# Altium footprint library 20210518.PcbLib: 414 footprints (part 2 of 26)
Each footprint in its own frame and in the unit in brackets; x right, y up, seen from the top. Pads: shape width x height; smd on the part's side, far side on the other; paste and mask are expansions set on the pad; w line width, h text height; cw(c..) or ccw(c..) is an arc to the next point about the centre after c.
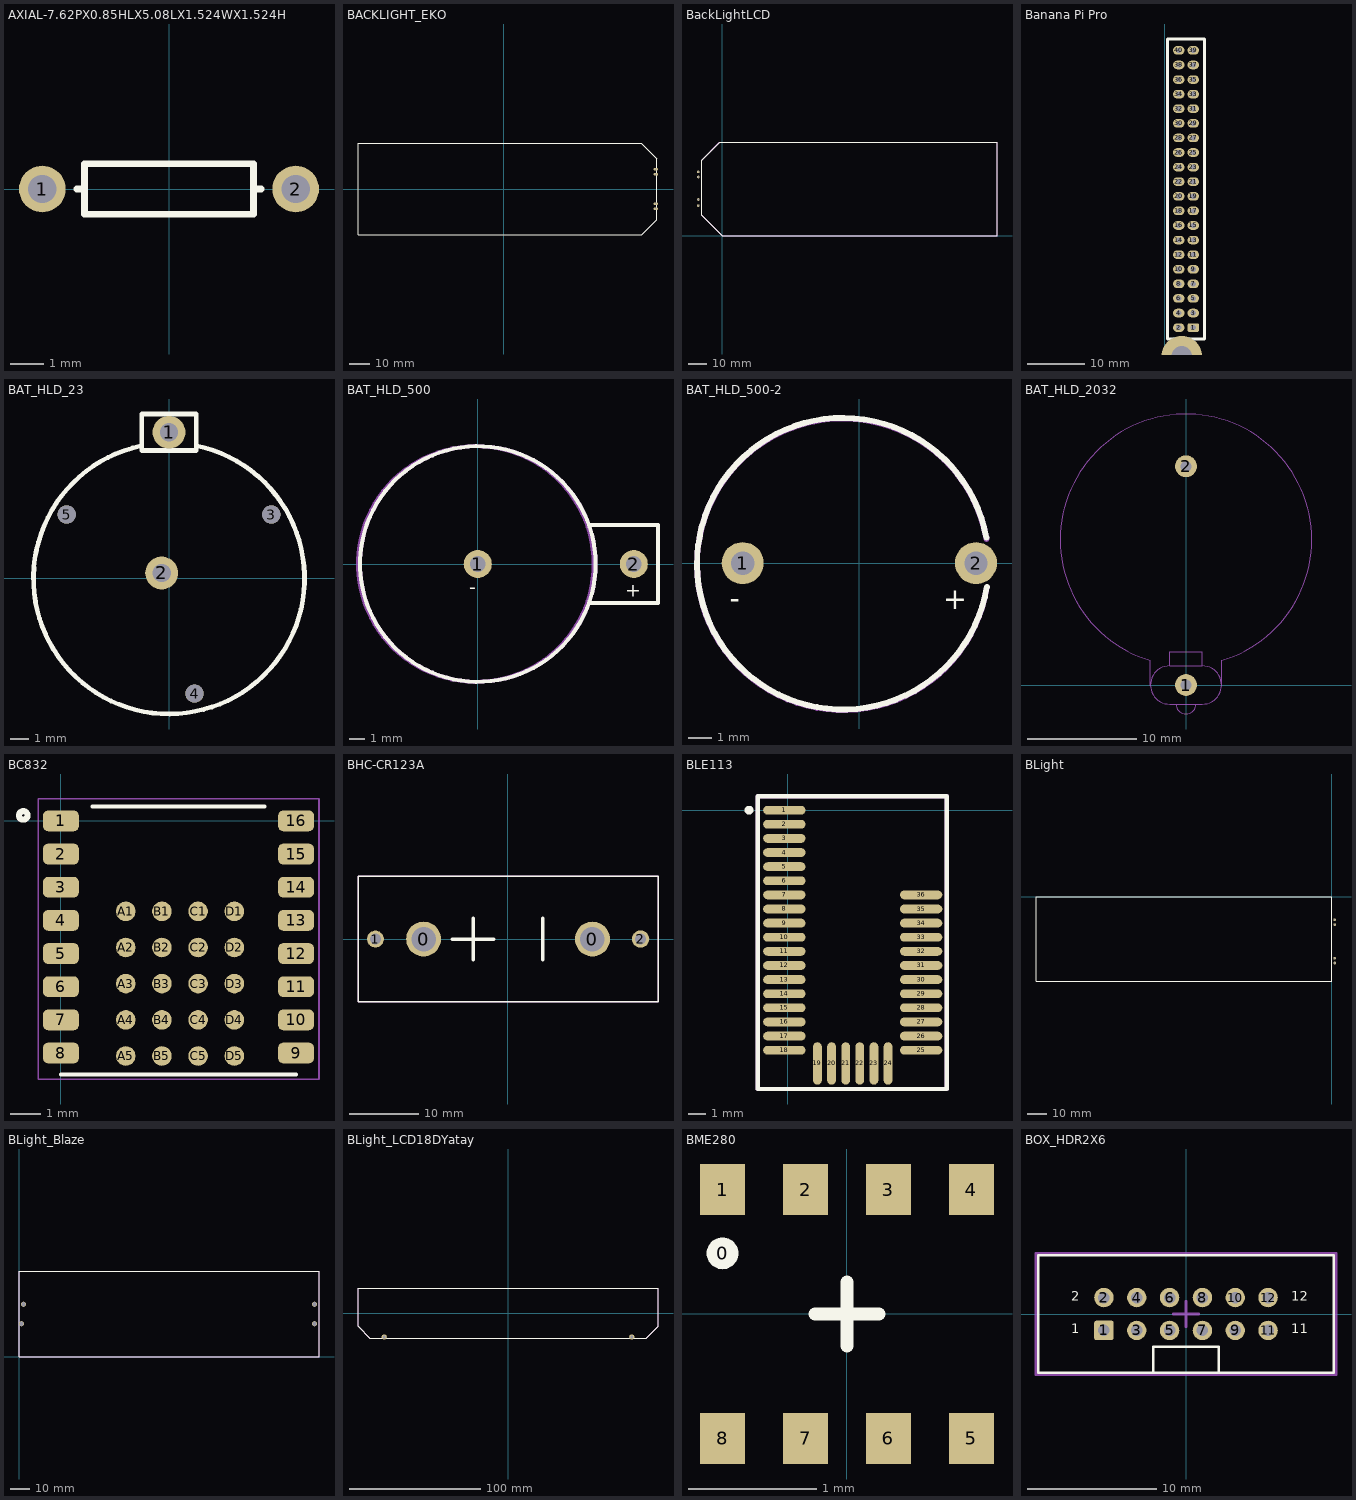
[diagram p1: the footprints below, top view; thin cyan lines are the x and y axes]

## AXIAL-7.62PX0.85HLX5.08LX1.524WX1.524H [mm] "Axial Device, 7.62 pin space, body 5.05mmx1.524mm, 0.85mm hole, 1.524mm height"
height 1.524
pads (2):
  round 1.4 hole 0.85: 1(-3.81,0) 2(3.81,0)
Top Overlay:
  lines w0.2: -2.769,0 -2.54,0 ; 2.769,0 2.54,0 ; 2.54,0 2.54,0.762 -2.54,0.762 -2.54,-0.762 2.54,-0.762 2.54,0
3D body: height 2, standoff -2, extent -4.05,-1.016 4.05,0.984

## BACKLIGHT_EKO [mm] "BackLight - EKO"
pads (4):
  oval 2.2x1.37 hole 0.8: 1(75.7,-9.85) 2(75.7,-7.309) 3(75.7,7.31) 4(75.7,9.85)
Top Overlay:
  lines w0.254: 76.099,-11.4 76.1,11.2 ; 76.1,-11.149 76.1,-15.278 68.606,-22.772 -72.661,-22.772 -72.661,22.786 68.407,22.786 76.1,15.093 76.1,10.951
3D body: height 3.35, standoff 0, extent -72.6,-22.849 76.1,22.851

## BackLightLCD [mm]
pads (4):
  round 1.4 hole 0.85: 1(-12.7,33.93) 2(-12.7,31.2) 3(-12.7,19.2) 4(-12.7,15.94)
Top Overlay:
  lines w0.254: -10.8,10.8 -10.8,18.15 -10.8,32.85 -10.8,40.2 -1.4,49.6 144.2,49.6 146.3,49.6 146.6,49.6 146.6,0 0,0 -10.8,10.8
Mechanical 13:
  lines w0.254: 146.6,0 0,0 -10.8,10.8 -10.8,40.2 -1.4,49.6 146.6,49.6
Mechanical 15:
  lines w0.254: -10.8,10.8 0,0 146.6,0 146.6,49.6 -1.4,49.6 -10.8,40.2 -10.8,10.8
3D body: height 3.35, standoff 0, extent -10.8,0 146.6,49.6

## Banana Pi Pro [mm]
pads (40):
  rrect40% 2x1.5 hole 0.9: 1(5.01,7.97)
  oval 2x1.5 hole 0.9: 2(2.47,7.97) 3(5.01,10.51) 4(2.47,10.51) 5(5.01,13.05) 6(2.47,13.05) 7(5.01,15.59) 8(2.47,15.59) 9(5.01,18.13) 10(2.47,18.13) 11(5.01,20.67) 12(2.47,20.67) 13(5.01,23.21) 14(2.47,23.21) 15(5.01,25.75) 16(2.47,25.75) 17(5.01,28.29) 18(2.47,28.29) 19(5.01,30.83) 20(2.47,30.83) 21(5.01,33.37) 22(2.47,33.37) 23(5.01,35.91) 24(2.47,35.91) 25(5.01,38.45) 26(2.47,38.45) 27(5.01,40.99) 28(2.47,40.99) 29(5.01,43.53) 30(2.47,43.53) 31(5.01,46.07) 32(2.47,46.07) 33(5.01,48.61) 34(2.47,48.61) 35(5.01,51.15) 36(2.47,51.15) 37(5.01,53.69) 38(2.47,53.69) 39(5.01,56.23) 40(2.47,56.23)
via 3,3 diameter 7 hole 3.5
via 52,3 diameter 7 hole 3.5
via 3,88.5 diameter 7 hole 3.5
via 57,88.5 diameter 7 hole 3.5
Top Overlay:
  lines w0.5: 4.93,7.89 5.01,7.97 ; 0.49,5.99 6.99,5.99 6.99,58.21 0.49,58.21 0.49,5.99
3D body: height 17, standoff -3.1, extent -2.01,-0.99 64.49,95.51

## BAT_HLD_23 [mm]
pads (5):
  round 1.8 hole 1: 1(0,8) 2(-0.4,0.3)
  round 1 hole 1: 3(5.6,3.5) 4(1.4,-6.3) 5(-5.6,3.5)
Top Overlay:
  lines w0.254: -1.559,7.251 ccw(c0,0) 1.493,7.265 ; -1.5,7 -1.5,9 0,9 1.5,9 1.5,7 -1.5,7
3D body: height 4.94, standoff 0, extent -7.497,-9.15 7.5,9.35

## BAT_HLD_500 [mm] "Battery Holder, Keystone 500"
height 7.1
pads (2):
  round 1.8 hole 1: 1(0,0) 2(10,0)
Top Overlay:
  circle w0.254: c0,0 r7.55
  lines w0.254: 7.125,-2.5 11.55,-2.5 11.55,2.5 7.125,2.5
  text "-" at -0.55,-2.225 h1.52
  text "+" at 9.45,-2.425 h1.52
Mechanical 13:
  circle w0.254: c0,0 r7.55
Mechanical 15:
  circle w0.254: c-0.127,0 r7.55
3D body: height 5, standoff -6.1, extent -7.63,-7.54 11.47,7.56

## BAT_HLD_500-2 [mm] "Battery Holder, Keystone 500"
height 7.1
pads (2):
  round 1.8 hole 1: 1(-5,0) 2(5,0)
Top Overlay:
  lines w0.254: 5.441,1.097 ccw(c-0.707,-0.025) 5.462,-1.024
  text "+" at 3.607,-2.286 h1.52
  text "-" at -5.55,-2.225 h1.52
Mechanical 13:
  lines w0.254: 5.447,1.038 ccw(c-0.707,-0.051) 5.462,-1.049
Mechanical 15:
  lines w0.254: 5.441,1.072 ccw(c-0.707,-0.051) 5.462,-1.049
3D body: height 3.75, standoff -4, extent -5.1,-4.999 5.1,5

## BAT_HLD_2032 [mm] "Battery Holder (Open) Coin, 20.0mm 1 Cell PC Pin"
pads (2):
  round 2 hole 1: 1(0,0) 2(0,20)
Mechanical 5:
  lines w0.1: -0.9,-1.75 ccw(c0,-1.75) 0.9,-1.75 ; -3.25,0 cw(c-1.5,0) -1.5,1.75 ; -3.25,0 ccw(c-1.5,0) -1.5,-1.75 1.5,-1.75 ccw(c1.5,0) 3.25,0 ; -3.25,0 -3.25,2.25 cw(c0,13.281) 3.25,2.25 3.25,0 ; -1.5,1.75 -1.5,3.05 1.5,3.05 1.5,1.75 ; -1.5,1.75 1.5,1.75 ; 1.5,1.75 cw(c1.5,0) 3.25,0 ; -0.35,-0.25 -0.35,0.25 0.35,0.25 0.35,-0.25 -0.35,-0.25
3D body: height 9.17, standoff -3, extent -11.501,-2.596 11.498,24.836

## BC832 [mm] "Bluetooth Bluetooth v5.0 Transceiver Module 2.4GHz Integrated, Chip Surface Mount"
pads (36):
  rrect50% 1.19x0.69 smd: 1(0,0) 2(0,-1.1) 3(0,-2.2) 4(0,-3.3) 5(0,-4.4) 6(0,-5.5) 7(0,-6.6) 8(0,-7.7) 9(7.8,-7.7) 10(7.8,-6.6) 11(7.8,-5.5) 12(7.8,-4.4) 13(7.8,-3.3) 14(7.8,-2.2) 15(7.8,-1.1) 16(7.8,0)
  round 0.65 smd: A1(2.15,-2.999) A2(2.15,-4.199) A3(2.15,-5.399) A4(2.15,-6.599) A5(2.15,-7.799) B1(3.35,-2.999) B2(3.35,-4.199) B3(3.35,-5.399) B4(3.35,-6.599) B5(3.35,-7.799) C1(4.55,-2.999) C2(4.55,-4.199) C3(4.55,-5.399) C4(4.55,-6.599) C5(4.55,-7.799) D1(5.75,-2.999) D2(5.75,-4.199) D3(5.75,-5.399) D4(5.75,-6.599) D5(5.75,-7.799)
Top Overlay:
  circle w0.2: c-1.25,0.182 r0.141
  lines w0.127: 0,-8.418 7.8,-8.418 ; 1.05,0.482 6.75,0.482
Mechanical 15:
  lines w0.05: -0.76,-8.568 -0.75,0.732 8.56,0.732 8.56,-8.568 -0.76,-8.568
3D body: height 1.3, standoff 0, extent 0,-8.343 7.8,0.457

## BHC-CR123A [mil] "Battery Holder (Open) CR123A 1 Cell PC Pin"
pads (4):
  round 197 hole 138: 0(-476.38,0) 0(477,0)
  round 95 hole 63: 1(-748.03,0)
  round 98 hole 63: 2(749,0)
Top Overlay:
  lines w8: -846.46,-354.33 -846.46,355 847,355 847,-354.33 -846.46,-354.33
  lines w19.68: -314.96,0 -78.74,0 ; -196.85,-118.11 -196.85,118.11 ; 196.85,-118.11 196.85,118.11
Mechanical 16:
  lines w8: -846.46,-354.33 847,-354.33 847,355 -846.46,355 -846.46,-354.33
3D body: height 475.98, standoff -156.3, extent -846.46,-350 846.46,350

## BLE113 [mm]
pads (36):
  oval 2.4x0.5 smd: 1(-0.2,0) 2(-0.2,-0.8) 3(-0.2,-1.6) 4(-0.2,-2.4) 5(-0.2,-3.2) 6(-0.2,-4) 7(-0.2,-4.8) 8(-0.2,-5.6) 9(-0.2,-6.4) 10(-0.2,-7.2) 11(-0.2,-8) 12(-0.2,-8.8) 13(-0.2,-9.6) 14(-0.2,-10.4) 15(-0.2,-11.2) 16(-0.2,-12) 17(-0.2,-12.8) 18(-0.2,-13.6) 25(7.55,-13.6) 26(7.55,-12.8) 27(7.55,-12) 28(7.55,-11.2) 29(7.55,-10.4) 30(7.55,-9.6) 31(7.55,-8.8) 32(7.55,-8) 33(7.55,-7.2) 34(7.55,-6.4) 35(7.55,-5.6) 36(7.55,-4.8)
  oval 0.5x2.4 smd: 19(1.675,-14.35) 20(2.475,-14.35) 21(3.275,-14.35) 22(4.075,-14.35) 23(4.875,-14.35) 24(5.675,-14.35)
Top Overlay:
  circle w0.3: c-2.2,0 r0.1
  lines w0.254: -1.7,-15.8 -1.7,0.8 9,0.8 9,-15.8 -1.7,-15.8
Mechanical 15:
  lines w0.254: -1.7,-15.8 9,-15.8 9,0.8 -1.7,0.8 -1.7,-15.8
3D body: height 1.9, standoff 0, extent -0.895,-15.05 8.255,0.68

## BLight [mm] "pazarcý tipi ile gelen"
pads (4):
  round 1.4 hole 0.85: 1(1.5,-11.9) 2(1.5,-14.4) 3(1.5,-31.9) 4(1.5,-34.4)
Top Overlay:
  lines w0.254: -154,-43.8 0,-43.8 0,0 -154,0 -154,-43.8
3D body: height 5, standoff 3.5, extent -154,-43.8 0,0

## BLight_Blaze [mm] "Blaze'den gelen numune backlight"
pads (4):
  round 2.6 hole 2.1: 1(1.3,16.9) 2(2.3,26.9) 3(151.7,16.9) 4(151.7,26.9)
Top Overlay:
  lines w0.254: 0,0 154,0 154,43.8 0,43.8 0,0
Mechanical 13:
  lines w0.254: 0,0 154,0 154,43.8 0,43.8 ; 153.99,0 154,0.01
Mechanical 15:
  lines w0.254: 153.99,0 0,0 0,43.8 154,43.8 154,0.01
3D body: height 3.3, standoff 0.4, extent 0,0 154,43.8

## BLight_LCD18DYatay [mm] "tek satýr LCD için backlight"
pads (2):
  round 4 hole 2.1: 1(-94.5,-18) 2(94.5,-18)
Top Overlay:
  lines w0.254: -114.5,-10.01 -105.51,-19 -104.55,-19 ; -114.5,-10 -114.5,19 114.5,19 114.5,-10 105.5,-19 104.55,-19 ; -104.5,-19 104.5,-19
Mechanical 13:
  lines w0.254: -114.5,-10.01 -105.51,-19 ; -114.5,-10 -114.5,19 114.5,19 114.5,-10 105.5,-19 ; -114.5,18.98 -114.49,18.99 ; -104.5,-19 104.5,-19
Mechanical 15:
  lines w0.254: -114.5,-10.01 -105.51,-19 ; -114.5,-10 -114.5,19 114.5,19 114.5,-10 105.5,-19 ; -104.5,-19 104.5,-19
3D body: height 3.2, standoff -3.4, extent -114.5,-19 114.5,19

## BME280 [mm]
height 1
pads (9):
  round 0.25 on Top Overlay: 0(-0.975,0.475)
  rect 0.35x0.4 smd: 1(-0.975,0.975) 2(-0.325,0.975) 3(0.325,0.975) 4(0.975,0.975) 5(0.975,-0.975) 6(0.325,-0.975) 7(-0.325,-0.975) 8(-0.975,-0.975)
Top Overlay:
  lines w0.1: -0.25,0 0.25,0 ; 0,-0.25 0,0.25
3D body: height 1, standoff 0, extent -1.25,-1.25 1.25,1.25
3D body: height 1.01, standoff 1, extent -1.124,0.325 -0.825,0.625

## BOX_HDR2X6 [mm] "Connector; Box Header; 6x2 Position"
height 9
pads (12):
  rrect20% 1.5x1.5 hole 0.9: 1(-6.35,-1.27)
  round 1.5 hole 0.9: 2(-6.35,1.27) 3(-3.81,-1.27) 4(-3.81,1.27) 5(-1.27,-1.27) 6(-1.27,1.27) 7(1.27,-1.27) 8(1.27,1.27) 9(3.81,-1.27) 10(3.81,1.27) 11(6.35,-1.27) 12(6.35,1.27)
Top Overlay:
  lines w0.2: -2.525,-4.55 -2.525,-2.525 2.525,-2.525 2.525,-4.55 ; 11.42,4.535 11.42,-4.55 -3.705,-4.55 -11.42,-4.55 -11.42,4.55 -3.705,4.55 11.42,4.55
  text "2" at -8.89,0.762 h1.27
  text "1" at -8.89,-1.778 h1.27
  text "11" at 8.128,-1.778 h1.27
  text "12" at 8.128,0.762 h1.27
Mechanical 15:
  lines w0.2: -1,0 1,0 ; 0,-1 0,1 ; -11.6,-4.7 11.6,-4.7 11.6,4.7 -11.6,4.7 -11.6,-4.7
3D body: height 8.9, standoff -3.2, extent -11.43,-4.45 11.43,4.65